# Altium schematic symbol library jlcpcb_2025_04_capacitors_extended_0805.schlib: 3281 symbols (part 13 of 18)
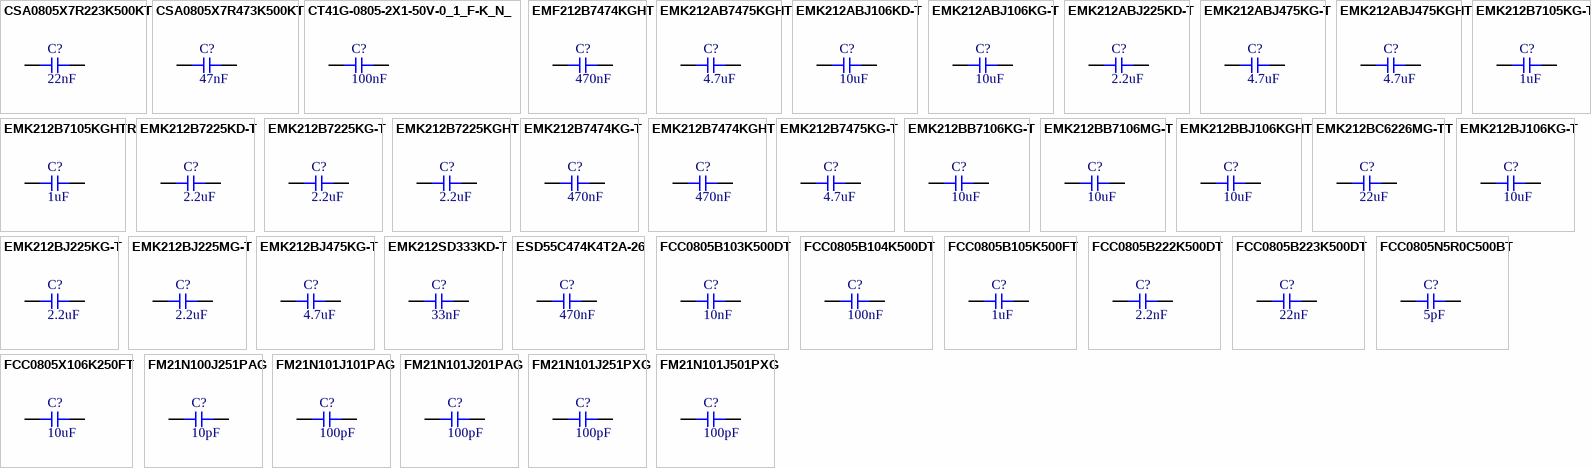
[diagram p94: symbols CSA0805X7R223K500KT to FM21N101J501PXG]

## EMK212B7225KD-T
designator C?  Capacitance: 2.2uF  (hidden comment: *)
Capacitor, Ceramic (MLCC), 2.2uF, ±10%, 16V, X7R, ±10%, SMD 0805; Manufacturer: Taiyo Yuden; Manufacturer Part Number: EMK212B7225KD-T; Package Size: 0805; JLCPCB Basic Part: No; JLCPCB Part Number: C311688; Supplier 1: LCSC; Category: Capacitors - MLCC; Supplier Part Number 1: C311688; Tolerance: ±10%; Voltage Rating: 16V; Temperature Coefficient: X7R; RoHS: Yes; ComponentLink1Description: Datasheet; ComponentLink1URL: https://wmsc.lcsc.com/wmsc/upload/file/pdf/v2/lcsc/2211282230_Taiyo-Yuden-EMK212B7225KD-T_C311688.pdf; ComponentLink2Description: JLCPCB Part URL; ComponentLink2URL: https://jlcpcb.com/partdetail/C311688; ComponentLink3Description: LCSC Part URL; ComponentLink3URL: https://lcsc.com/product-detail/Multilayer-Ceramic-Capacitors-MLCC---SMD-SMT_Taiyo-Yuden-Taiyo-Yuden-EMK212B7225KD-T_C311688.html
footprint CAP-0805 (0805 (2012M) Capacitor)
pins: 1, 2

## EMK212B7225KG-T
designator C?  Capacitance: 2.2uF  (hidden comment: *)
Capacitor, Ceramic (MLCC), 2.2uF, ±10%, 16V, X7R, ±10%, SMD 0805; Manufacturer: Taiyo Yuden; Manufacturer Part Number: EMK212B7225KG-T; Package Size: 0805; JLCPCB Basic Part: No; JLCPCB Part Number: C92761; Supplier 1: LCSC; Category: Capacitors - MLCC; Supplier Part Number 1: C92761; Tolerance: ±10%; Voltage Rating: 16V; Temperature Coefficient: X7R; RoHS: Yes; ComponentLink1Description: Datasheet; ComponentLink1URL: https://wmsc.lcsc.com/wmsc/upload/file/pdf/v2/lcsc/1810091431_Taiyo-Yuden-EMK212B7225KG-T_C92761.pdf; ComponentLink2Description: JLCPCB Part URL; ComponentLink2URL: https://jlcpcb.com/partdetail/C92761; ComponentLink3Description: LCSC Part URL; ComponentLink3URL: https://lcsc.com/product-detail/Multilayer-Ceramic-Capacitors-MLCC---SMD-SMT_Taiyo-Yuden-Taiyo-Yuden-EMK212B7225KG-T_C92761.html
footprint CAP-0805 (0805 (2012M) Capacitor)
pins: 1, 2

## EMK212B7225KGHT
designator C?  Capacitance: 2.2uF  (hidden comment: *)
Capacitor, Ceramic (MLCC), 2.2uF, ±10%, 16V, X7R, ±10%, SMD 0805; Manufacturer: Taiyo Yuden; Manufacturer Part Number: EMK212B7225KGHT; Package Size: 0805; JLCPCB Basic Part: No; JLCPCB Part Number: C385899; Supplier 1: LCSC; Category: Capacitors - MLCC; Supplier Part Number 1: C385899; Tolerance: ±10%; Voltage Rating: 16V; Temperature Coefficient: X7R; RoHS: Yes; ComponentLink1Description: Datasheet; ComponentLink1URL: https://wmsc.lcsc.com/wmsc/upload/file/pdf/v2/lcsc/2304140030_Taiyo-Yuden-EMK212B7225KGHT_C385899.pdf; ComponentLink2Description: JLCPCB Part URL; ComponentLink2URL: https://jlcpcb.com/partdetail/C385899; ComponentLink3Description: LCSC Part URL; ComponentLink3URL: https://lcsc.com/product-detail/Multilayer-Ceramic-Capacitors-MLCC---SMD-SMT_Taiyo-Yuden-Taiyo-Yuden-EMK212B7225KGHT_C385899.html
footprint CAP-0805 (0805 (2012M) Capacitor)
pins: 1, 2

## EMK212B7474KG-T
designator C?  Capacitance: 470nF  (hidden comment: *)
Capacitor, Ceramic (MLCC), 470nF, ±10%, 16V, X7R, ±10%, SMD 0805; Manufacturer: Taiyo Yuden; Manufacturer Part Number: EMK212B7474KG-T; Package Size: 0805; JLCPCB Basic Part: No; JLCPCB Part Number: C385900; Supplier 1: LCSC; Category: Capacitors - MLCC; Supplier Part Number 1: C385900; Tolerance: ±10%; Voltage Rating: 16V; Temperature Coefficient: X7R; RoHS: Yes; ComponentLink1Description: Datasheet; ComponentLink1URL: https://wmsc.lcsc.com/wmsc/upload/file/pdf/v2/lcsc/2211282230_Taiyo-Yuden-EMK212B7474KG-T_C385900.pdf; ComponentLink2Description: JLCPCB Part URL; ComponentLink2URL: https://jlcpcb.com/partdetail/C385900; ComponentLink3Description: LCSC Part URL; ComponentLink3URL: https://lcsc.com/product-detail/Multilayer-Ceramic-Capacitors-MLCC---SMD-SMT_Taiyo-Yuden-Taiyo-Yuden-EMK212B7474KG-T_C385900.html
footprint CAP-0805 (0805 (2012M) Capacitor)
pins: 1, 2

## EMK212B7474KGHT
designator C?  Capacitance: 470nF  (hidden comment: *)
Capacitor, Ceramic (MLCC), 470nF, ±10%, 16V, X7R, ±10%, SMD 0805; Manufacturer: Taiyo Yuden; Manufacturer Part Number: EMK212B7474KGHT; Package Size: 0805; JLCPCB Basic Part: No; JLCPCB Part Number: C651025; Supplier 1: LCSC; Category: Capacitors - MLCC; Supplier Part Number 1: C651025; Tolerance: ±10%; Voltage Rating: 16V; Temperature Coefficient: X7R; RoHS: Yes; ComponentLink1Description: Datasheet; ComponentLink1URL: https://wmsc.lcsc.com/wmsc/upload/file/pdf/v2/lcsc/2304140030_Taiyo-Yuden-EMK212B7474KGHT_C651025.pdf; ComponentLink2Description: JLCPCB Part URL; ComponentLink2URL: https://jlcpcb.com/partdetail/C651025; ComponentLink3Description: LCSC Part URL; ComponentLink3URL: https://lcsc.com/product-detail/Multilayer-Ceramic-Capacitors-MLCC---SMD-SMT_Taiyo-Yuden-Taiyo-Yuden-EMK212B7474KGHT_C651025.html
footprint CAP-0805 (0805 (2012M) Capacitor)
pins: 1, 2

## EMK212B7475KG-T
designator C?  Capacitance: 4.7uF  (hidden comment: *)
Capacitor, Ceramic (MLCC), 4.7uF, ±10%, 16V, X7R, ±10%, SMD 0805; Manufacturer: Taiyo Yuden; Manufacturer Part Number: EMK212B7475KG-T; Package Size: 0805; JLCPCB Basic Part: No; JLCPCB Part Number: C92762; Supplier 1: LCSC; Category: Capacitors - MLCC; Supplier Part Number 1: C92762; Tolerance: ±10%; Voltage Rating: 16V; Temperature Coefficient: X7R; RoHS: Yes; ComponentLink1Description: Datasheet; ComponentLink1URL: https://wmsc.lcsc.com/wmsc/upload/file/pdf/v2/lcsc/2211282300_Taiyo-Yuden-EMK212B7475KG-T_C92762.pdf; ComponentLink2Description: JLCPCB Part URL; ComponentLink2URL: https://jlcpcb.com/partdetail/C92762; ComponentLink3Description: LCSC Part URL; ComponentLink3URL: https://lcsc.com/product-detail/Multilayer-Ceramic-Capacitors-MLCC---SMD-SMT_Taiyo-Yuden-Taiyo-Yuden-EMK212B7475KG-T_C92762.html
footprint CAP-0805 (0805 (2012M) Capacitor)
pins: 1, 2

## EMK212BB7106KG-T
designator C?  Capacitance: 10uF  (hidden comment: *)
Capacitor, Ceramic (MLCC), 10uF, ±10%, 16V, X7R, ±10%, SMD 0805; Manufacturer: Taiyo Yuden; Manufacturer Part Number: EMK212BB7106KG-T; Package Size: 0805; JLCPCB Basic Part: No; JLCPCB Part Number: C2182156; Supplier 1: LCSC; Category: Capacitors - MLCC; Supplier Part Number 1: C2182156; Tolerance: ±10%; Voltage Rating: 16V; Temperature Coefficient: X7R; RoHS: Yes; ComponentLink1Description: Datasheet; ComponentLink1URL: https://wmsc.lcsc.com/wmsc/upload/file/pdf/v2/lcsc/2211282000_Taiyo-Yuden-EMK212BB7106KG-T_C2182156.pdf; ComponentLink2Description: JLCPCB Part URL; ComponentLink2URL: https://jlcpcb.com/partdetail/C2182156; ComponentLink3Description: LCSC Part URL; ComponentLink3URL: https://lcsc.com/product-detail/Multilayer-Ceramic-Capacitors-MLCC---SMD-SMT_Taiyo-Yuden-Taiyo-Yuden-EMK212BB7106KG-T_C2182156.html
footprint CAP-0805 (0805 (2012M) Capacitor)
pins: 1, 2

## EMK212BB7106MG-T
designator C?  Capacitance: 10uF  (hidden comment: *)
Capacitor, Ceramic (MLCC), 10uF, ±20%, 16V, X7R, ±20%, SMD 0805; Manufacturer: Taiyo Yuden; Manufacturer Part Number: EMK212BB7106MG-T; Package Size: 0805; JLCPCB Basic Part: No; JLCPCB Part Number: C141287; Supplier 1: LCSC; Category: Capacitors - MLCC; Supplier Part Number 1: C141287; Tolerance: ±20%; Voltage Rating: 16V; Temperature Coefficient: X7R; RoHS: Yes; ComponentLink1Description: Datasheet; ComponentLink1URL: https://wmsc.lcsc.com/wmsc/upload/file/pdf/v2/lcsc/1810091451_Taiyo-Yuden-EMK212BB7106MG-T_C141287.pdf; ComponentLink2Description: JLCPCB Part URL; ComponentLink2URL: https://jlcpcb.com/partdetail/C141287; ComponentLink3Description: LCSC Part URL; ComponentLink3URL: https://lcsc.com/product-detail/Multilayer-Ceramic-Capacitors-MLCC---SMD-SMT_Taiyo-Yuden-Taiyo-Yuden-EMK212BB7106MG-T_C141287.html
footprint CAP-0805 (0805 (2012M) Capacitor)
pins: 1, 2

## EMK212BBJ106KGHT
designator C?  Capacitance: 10uF  (hidden comment: *)
Capacitor, Ceramic (MLCC), 10uF, ±10%, 16V, X5R, ±10%, SMD 0805; Manufacturer: Taiyo Yuden; Manufacturer Part Number: EMK212BBJ106KGHT; Package Size: 0805; JLCPCB Basic Part: No; JLCPCB Part Number: C650950; Supplier 1: LCSC; Category: Capacitors - MLCC; Supplier Part Number 1: C650950; Tolerance: ±10%; Voltage Rating: 16V; Temperature Coefficient: X5R; RoHS: Yes; ComponentLink1Description: Datasheet; ComponentLink1URL: https://wmsc.lcsc.com/wmsc/upload/file/pdf/v2/lcsc/2211282200_Taiyo-Yuden-EMK212BBJ106KGHT_C650950.pdf; ComponentLink2Description: JLCPCB Part URL; ComponentLink2URL: https://jlcpcb.com/partdetail/C650950; ComponentLink3Description: LCSC Part URL; ComponentLink3URL: https://lcsc.com/product-detail/Multilayer-Ceramic-Capacitors-MLCC---SMD-SMT_Taiyo-Yuden-Taiyo-Yuden-EMK212BBJ106KGHT_C650950.html
footprint CAP-0805 (0805 (2012M) Capacitor)
pins: 1, 2

## EMK212BC6226MG-TT
designator C?  Capacitance: 22uF  (hidden comment: *)
Capacitor, Ceramic (MLCC), 22uF, ±20%, 16V, X6S, ±20%, SMD 0805; Manufacturer: Taiyo Yuden; Manufacturer Part Number: EMK212BC6226MG-TT; Package Size: 0805; JLCPCB Basic Part: No; JLCPCB Part Number: C2179928; Supplier 1: LCSC; Category: Capacitors - MLCC; Supplier Part Number 1: C2179928; Tolerance: ±20%; Voltage Rating: 16V; Temperature Coefficient: X6S; RoHS: Yes; ComponentLink1Description: Datasheet; ComponentLink1URL: https://wmsc.lcsc.com/wmsc/upload/file/pdf/v2/lcsc/2309051402_Taiyo-Yuden-EMK212BC6226MG-TT_C2179928.pdf; ComponentLink2Description: JLCPCB Part URL; ComponentLink2URL: https://jlcpcb.com/partdetail/C2179928; ComponentLink3Description: LCSC Part URL; ComponentLink3URL: https://lcsc.com/product-detail/Multilayer-Ceramic-Capacitors-MLCC---SMD-SMT_Taiyo-Yuden-Taiyo-Yuden-EMK212BC6226MG-TT_C2179928.html
footprint CAP-0805 (0805 (2012M) Capacitor)
pins: 1, 2

## EMK212BJ106KG-T
designator C?  Capacitance: 10uF  (hidden comment: *)
Capacitor, Ceramic (MLCC), 10uF, ±10%, 16V, X5R, ±10%, SMD 0805; Manufacturer: Taiyo Yuden; Manufacturer Part Number: EMK212BJ106KG-T; Package Size: 0805; JLCPCB Basic Part: No; JLCPCB Part Number: C87157; Supplier 1: LCSC; Category: Capacitors - MLCC; Supplier Part Number 1: C87157; Tolerance: ±10%; Voltage Rating: 16V; Temperature Coefficient: X5R; RoHS: Yes; ComponentLink1Description: Datasheet; ComponentLink1URL: https://wmsc.lcsc.com/wmsc/upload/file/pdf/v2/lcsc/2304140030_Taiyo-Yuden-EMK212BJ106KG-T_C87157.pdf; ComponentLink2Description: JLCPCB Part URL; ComponentLink2URL: https://jlcpcb.com/partdetail/C87157; ComponentLink3Description: LCSC Part URL; ComponentLink3URL: https://lcsc.com/product-detail/Multilayer-Ceramic-Capacitors-MLCC---SMD-SMT_Taiyo-Yuden-Taiyo-Yuden-EMK212BJ106KG-T_C87157.html
footprint CAP-0805 (0805 (2012M) Capacitor)
pins: 1, 2

## EMK212BJ225KG-T
designator C?  Capacitance: 2.2uF  (hidden comment: *)
Capacitor, Ceramic (MLCC), 2.2uF, ±10%, 16V, X5R, ±10%, SMD 0805; Manufacturer: Taiyo Yuden; Manufacturer Part Number: EMK212BJ225KG-T; Package Size: 0805; JLCPCB Basic Part: No; JLCPCB Part Number: C319190; Supplier 1: LCSC; Category: Capacitors - MLCC; Supplier Part Number 1: C319190; Tolerance: ±10%; Voltage Rating: 16V; Temperature Coefficient: X5R; RoHS: Yes; ComponentLink1Description: Datasheet; ComponentLink1URL: https://wmsc.lcsc.com/wmsc/upload/file/pdf/v2/lcsc/2304140030_Taiyo-Yuden-EMK212BJ225KG-T_C319190.pdf; ComponentLink2Description: JLCPCB Part URL; ComponentLink2URL: https://jlcpcb.com/partdetail/C319190; ComponentLink3Description: LCSC Part URL; ComponentLink3URL: https://lcsc.com/product-detail/Multilayer-Ceramic-Capacitors-MLCC---SMD-SMT_Taiyo-Yuden-Taiyo-Yuden-EMK212BJ225KG-T_C319190.html
footprint CAP-0805 (0805 (2012M) Capacitor)
pins: 1, 2

## EMK212BJ225MG-T
designator C?  Capacitance: 2.2uF  (hidden comment: *)
Capacitor, Ceramic (MLCC), 2.2uF, ±20%, 16V, X5R, ±20%, SMD 0805; Manufacturer: Taiyo Yuden; Manufacturer Part Number: EMK212BJ225MG-T; Package Size: 0805; JLCPCB Basic Part: No; JLCPCB Part Number: C651026; Supplier 1: LCSC; Category: Capacitors - MLCC; Supplier Part Number 1: C651026; Tolerance: ±20%; Voltage Rating: 16V; Temperature Coefficient: X5R; RoHS: Yes; ComponentLink1Description: Datasheet; ComponentLink1URL: https://wmsc.lcsc.com/wmsc/upload/file/pdf/v2/lcsc/2304140030_Taiyo-Yuden-EMK212BJ225MG-T_C651026.pdf; ComponentLink2Description: JLCPCB Part URL; ComponentLink2URL: https://jlcpcb.com/partdetail/C651026; ComponentLink3Description: LCSC Part URL; ComponentLink3URL: https://lcsc.com/product-detail/Multilayer-Ceramic-Capacitors-MLCC---SMD-SMT_Taiyo-Yuden-Taiyo-Yuden-EMK212BJ225MG-T_C651026.html
footprint CAP-0805 (0805 (2012M) Capacitor)
pins: 1, 2

## EMK212BJ475KG-T
designator C?  Capacitance: 4.7uF  (hidden comment: *)
Capacitor, Ceramic (MLCC), 4.7uF, ±10%, 16V, X5R, ±10%, SMD 0805; Manufacturer: Taiyo Yuden; Manufacturer Part Number: EMK212BJ475KG-T; Package Size: 0805; JLCPCB Basic Part: No; JLCPCB Part Number: C385902; Supplier 1: LCSC; Category: Capacitors - MLCC; Supplier Part Number 1: C385902; Tolerance: ±10%; Voltage Rating: 16V; Temperature Coefficient: X5R; RoHS: Yes; ComponentLink1Description: Datasheet; ComponentLink1URL: https://wmsc.lcsc.com/wmsc/upload/file/pdf/v2/lcsc/2304140030_Taiyo-Yuden-EMK212BJ475KG-T_C385902.pdf; ComponentLink2Description: JLCPCB Part URL; ComponentLink2URL: https://jlcpcb.com/partdetail/C385902; ComponentLink3Description: LCSC Part URL; ComponentLink3URL: https://lcsc.com/product-detail/Multilayer-Ceramic-Capacitors-MLCC---SMD-SMT_Taiyo-Yuden-Taiyo-Yuden-EMK212BJ475KG-T_C385902.html
footprint CAP-0805 (0805 (2012M) Capacitor)
pins: 1, 2

## EMK212SD333KD-T
designator C?  Capacitance: 33nF  (hidden comment: *)
Capacitor, Ceramic (MLCC), 33nF, ±10%, 16V, ±10%, SMD 0805; Manufacturer: Taiyo Yuden; Manufacturer Part Number: EMK212SD333KD-T; Package Size: 0805; JLCPCB Basic Part: No; JLCPCB Part Number: C524971; Supplier 1: LCSC; Category: Capacitors - MLCC; Supplier Part Number 1: C524971; Tolerance: ±10%; Voltage Rating: 16V; RoHS: Yes; ComponentLink1Description: Datasheet; ComponentLink1URL: https://wmsc.lcsc.com/wmsc/upload/file/pdf/v2/lcsc/2211282200_Taiyo-Yuden-EMK212SD333KD-T_C524971.pdf; ComponentLink2Description: JLCPCB Part URL; ComponentLink2URL: https://jlcpcb.com/partdetail/C524971; ComponentLink3Description: LCSC Part URL; ComponentLink3URL: https://lcsc.com/product-detail/Multilayer-Ceramic-Capacitors-MLCC---SMD-SMT_Taiyo-Yuden-Taiyo-Yuden-EMK212SD333KD-T_C524971.html
footprint CAP-0805 (0805 (2012M) Capacitor)
pins: 1, 2

## ESD55C474K4T2A-26
designator C?  Capacitance: 470nF  (hidden comment: *)
Capacitor, Ceramic (MLCC), 470nF, ±10%, 50V, X7R, ±10%, SMD 0805; Manufacturer: Kyocera AVX; Manufacturer Part Number: ESD55C474K4T2A-26; Package Size: 0805; JLCPCB Basic Part: No; JLCPCB Part Number: C2173088; Supplier 1: LCSC; Category: Capacitors - MLCC; Supplier Part Number 1: C2173088; Tolerance: ±10%; Voltage Rating: 50V; Temperature Coefficient: X7R; RoHS: Yes; ComponentLink1Description: Datasheet; ComponentLink1URL: https://wmsc.lcsc.com/wmsc/upload/file/pdf/v2/lcsc/2304140030_Kyocera-AVX-ESD55C474K4T2A-26_C2173088.pdf; ComponentLink2Description: JLCPCB Part URL; ComponentLink2URL: https://jlcpcb.com/partdetail/C2173088; ComponentLink3Description: LCSC Part URL; ComponentLink3URL: https://lcsc.com/product-detail/Multilayer-Ceramic-Capacitors-MLCC---SMD-SMT_Kyocera-AVX-Kyocera-AVX-ESD55C474K4T2A-26_C2173088.html
footprint CAP-0805 (0805 (2012M) Capacitor)
pins: 1, 2

## FCC0805B103K500DT
designator C?  Capacitance: 10nF  (hidden comment: *)
Capacitor, Ceramic (MLCC), 10nF, 50V, X7R, SMD 0805; Manufacturer: FOJAN; Manufacturer Part Number: FCC0805B103K500DT; Package Size: 0805; JLCPCB Basic Part: No; JLCPCB Part Number: C5137493; Supplier 1: LCSC; Category: Capacitors - MLCC; Supplier Part Number 1: C5137493; Voltage Rating: 50V; Temperature Coefficient: X7R; RoHS: Yes; ComponentLink1Description: Datasheet; ComponentLink1URL: https://wmsc.lcsc.com/wmsc/upload/file/pdf/v2/lcsc/2208181800_FOJAN-FCC0805B103K500DT_C5137493.pdf; ComponentLink2Description: JLCPCB Part URL; ComponentLink2URL: https://jlcpcb.com/partdetail/C5137493; ComponentLink3Description: LCSC Part URL; ComponentLink3URL: https://lcsc.com/product-detail/Multilayer-Ceramic-Capacitors-MLCC---SMD-SMT_FOJAN-FOJAN-FCC0805B103K500DT_C5137493.html
footprint CAP-0805 (0805 (2012M) Capacitor)
pins: 1, 2

## FCC0805B104K500DT
designator C?  Capacitance: 100nF  (hidden comment: *)
Capacitor, Ceramic (MLCC), 100nF, ±10%, 50V, X7R, ±10%, SMD 0805; Manufacturer: FOJAN; Manufacturer Part Number: FCC0805B104K500DT; Package Size: 0805; JLCPCB Basic Part: No; JLCPCB Part Number: C5137467; Supplier 1: LCSC; Category: Capacitors - MLCC; Supplier Part Number 1: C5137467; Tolerance: ±10%; Voltage Rating: 50V; Temperature Coefficient: X7R; RoHS: Yes; ComponentLink1Description: Datasheet; ComponentLink1URL: https://wmsc.lcsc.com/wmsc/upload/file/pdf/v2/lcsc/2208181800_FOJAN-FCC0805B104K500DT_C5137467.pdf; ComponentLink2Description: JLCPCB Part URL; ComponentLink2URL: https://jlcpcb.com/partdetail/C5137467; ComponentLink3Description: LCSC Part URL; ComponentLink3URL: https://lcsc.com/product-detail/Multilayer-Ceramic-Capacitors-MLCC---SMD-SMT_FOJAN-FOJAN-FCC0805B104K500DT_C5137467.html
footprint CAP-0805 (0805 (2012M) Capacitor)
pins: 1, 2

## FCC0805B105K500FT
designator C?  Capacitance: 1uF  (hidden comment: *)
Capacitor, Ceramic (MLCC), 1uF, ±10%, 50V, X7R, ±10%, SMD 0805; Manufacturer: FOJAN; Manufacturer Part Number: FCC0805B105K500FT; Package Size: 0805; JLCPCB Basic Part: No; JLCPCB Part Number: C5137478; Supplier 1: LCSC; Category: Capacitors - MLCC; Supplier Part Number 1: C5137478; Tolerance: ±10%; Voltage Rating: 50V; Temperature Coefficient: X7R; RoHS: Yes; ComponentLink1Description: Datasheet; ComponentLink1URL: https://wmsc.lcsc.com/wmsc/upload/file/pdf/v2/lcsc/2208181800_FOJAN-FCC0805B105K500FT_C5137478.pdf; ComponentLink2Description: JLCPCB Part URL; ComponentLink2URL: https://jlcpcb.com/partdetail/C5137478; ComponentLink3Description: LCSC Part URL; ComponentLink3URL: https://lcsc.com/product-detail/Multilayer-Ceramic-Capacitors-MLCC---SMD-SMT_FOJAN-FOJAN-FCC0805B105K500FT_C5137478.html
footprint CAP-0805 (0805 (2012M) Capacitor)
pins: 1, 2

## FCC0805B222K500DT
designator C?  Capacitance: 2.2nF  (hidden comment: *)
Capacitor, Ceramic (MLCC), 2.2nF, ±10%, 50V, X7R, ±10%, SMD 0805; Manufacturer: FOJAN; Manufacturer Part Number: FCC0805B222K500DT; Package Size: 0805; JLCPCB Basic Part: No; JLCPCB Part Number: C5137580; Supplier 1: LCSC; Category: Capacitors - MLCC; Supplier Part Number 1: C5137580; Tolerance: ±10%; Voltage Rating: 50V; Temperature Coefficient: X7R; RoHS: Yes; ComponentLink1Description: Datasheet; ComponentLink1URL: https://wmsc.lcsc.com/wmsc/upload/file/pdf/v2/lcsc/2208181800_FOJAN-FCC0805B222K500DT_C5137580.pdf; ComponentLink2Description: JLCPCB Part URL; ComponentLink2URL: https://jlcpcb.com/partdetail/C5137580; ComponentLink3Description: LCSC Part URL; ComponentLink3URL: https://lcsc.com/product-detail/Multilayer-Ceramic-Capacitors-MLCC---SMD-SMT_FOJAN-FOJAN-FCC0805B222K500DT_C5137580.html
footprint CAP-0805 (0805 (2012M) Capacitor)
pins: 1, 2

## FCC0805B223K500DT
designator C?  Capacitance: 22nF  (hidden comment: *)
Capacitor, Ceramic (MLCC), 22nF, ±10%, 50V, X7R, ±10%, SMD 0805; Manufacturer: FOJAN; Manufacturer Part Number: FCC0805B223K500DT; Package Size: 0805; JLCPCB Basic Part: No; JLCPCB Part Number: C5137639; Supplier 1: LCSC; Category: Capacitors - MLCC; Supplier Part Number 1: C5137639; Tolerance: ±10%; Voltage Rating: 50V; Temperature Coefficient: X7R; RoHS: Yes; ComponentLink1Description: Datasheet; ComponentLink1URL: https://wmsc.lcsc.com/wmsc/upload/file/pdf/v2/lcsc/2208181800_FOJAN-FCC0805B223K500DT_C5137639.pdf; ComponentLink2Description: JLCPCB Part URL; ComponentLink2URL: https://jlcpcb.com/partdetail/C5137639; ComponentLink3Description: LCSC Part URL; ComponentLink3URL: https://lcsc.com/product-detail/Multilayer-Ceramic-Capacitors-MLCC---SMD-SMT_FOJAN-FOJAN-FCC0805B223K500DT_C5137639.html
footprint CAP-0805 (0805 (2012M) Capacitor)
pins: 1, 2

## FCC0805N5R0C500BT
designator C?  Capacitance: 5pF  (hidden comment: *)
Capacitor, Ceramic (MLCC), 5pF, 50V, null, SMD 0805; Manufacturer: FOJAN; Manufacturer Part Number: FCC0805N5R0C500BT; Package Size: 0805; JLCPCB Basic Part: No; JLCPCB Part Number: C7419433; Supplier 1: LCSC; Category: Capacitors - MLCC; Supplier Part Number 1: C7419433; Voltage Rating: 50V; Temperature Coefficient: null; RoHS: Yes; ComponentLink1Description: Datasheet; ComponentLink1URL: https://wmsc.lcsc.com/wmsc/upload/file/pdf/v2/lcsc/2404021725_FOJAN-FCC0805N5R0C500BT_C7419433.pdf; ComponentLink2Description: JLCPCB Part URL; ComponentLink2URL: https://jlcpcb.com/partdetail/C7419433; ComponentLink3Description: LCSC Part URL; ComponentLink3URL: https://lcsc.com/product-detail/Multilayer-Ceramic-Capacitors-MLCC---SMD-SMT_FOJAN-FOJAN-FCC0805N5R0C500BT_C7419433.html
footprint CAP-0805 (0805 (2012M) Capacitor)
pins: 1, 2

## FCC0805X106K250FT
designator C?  Capacitance: 10uF  (hidden comment: *)
Capacitor, Ceramic (MLCC), 10uF, ±10%, 25V, X5R, ±10%, SMD 0805; Manufacturer: FOJAN; Manufacturer Part Number: FCC0805X106K250FT; Package Size: 0805; JLCPCB Basic Part: No; JLCPCB Part Number: C5137488; Supplier 1: LCSC; Category: Capacitors - MLCC; Supplier Part Number 1: C5137488; Tolerance: ±10%; Voltage Rating: 25V; Temperature Coefficient: X5R; RoHS: Yes; ComponentLink1Description: Datasheet; ComponentLink1URL: https://wmsc.lcsc.com/wmsc/upload/file/pdf/v2/lcsc/2208181800_FOJAN-FCC0805X106K250FT_C5137488.pdf; ComponentLink2Description: JLCPCB Part URL; ComponentLink2URL: https://jlcpcb.com/partdetail/C5137488; ComponentLink3Description: LCSC Part URL; ComponentLink3URL: https://lcsc.com/product-detail/Multilayer-Ceramic-Capacitors-MLCC---SMD-SMT_FOJAN-FOJAN-FCC0805X106K250FT_C5137488.html
footprint CAP-0805 (0805 (2012M) Capacitor)
pins: 1, 2

## FM21N100J251PAG
designator C?  Capacitance: 10pF  (hidden comment: *)
Capacitor, Ceramic (MLCC), 10pF, ±5%, 250V, C0G, ±5%, SMD 0805; Manufacturer: PSA(Prosperity Dielectrics); Manufacturer Part Number: FM21N100J251PAG; Package Size: 0805; JLCPCB Basic Part: No; JLCPCB Part Number: C2929106; Supplier 1: LCSC; Category: Capacitors - MLCC; Supplier Part Number 1: C2929106; Tolerance: ±5%; Voltage Rating: 250V; Temperature Coefficient: C0G; RoHS: Yes; ComponentLink1Description: Datasheet; ComponentLink1URL: https://wmsc.lcsc.com/wmsc/upload/file/pdf/v2/lcsc/2201121400_PSA-Prosperity-Dielectrics-FM21N100J251PAG_C2929106.pdf; ComponentLink2Description: JLCPCB Part URL; ComponentLink2URL: https://jlcpcb.com/partdetail/C2929106; ComponentLink3Description: LCSC Part URL; ComponentLink3URL: https://lcsc.com/product-detail/Multilayer-Ceramic-Capacitors-MLCC---SMD-SMT_PSAProsperity-Dielectrics-PSAProsperity-Dielectrics-FM21N100J251PAG_C2929106.html
footprint CAP-0805 (0805 (2012M) Capacitor)
pins: 1, 2

## FM21N101J101PAG
designator C?  Capacitance: 100pF  (hidden comment: *)
Capacitor, Ceramic (MLCC), 100pF, ±5%, 100V, NP0, ±5%, SMD 0805; Manufacturer: PSA(Prosperity Dielectrics); Manufacturer Part Number: FM21N101J101PAG; Package Size: 0805; JLCPCB Basic Part: No; JLCPCB Part Number: C784083; Supplier 1: LCSC; Category: Capacitors - MLCC; Supplier Part Number 1: C784083; Tolerance: ±5%; Voltage Rating: 100V; Temperature Coefficient: NP0; RoHS: Yes; ComponentLink1Description: Datasheet; ComponentLink1URL: https://wmsc.lcsc.com/wmsc/upload/file/pdf/v2/lcsc/2304140030_PSA-Prosperity-Dielectrics-FM21N101J101PAG_C784083.pdf; ComponentLink2Description: JLCPCB Part URL; ComponentLink2URL: https://jlcpcb.com/partdetail/C784083; ComponentLink3Description: LCSC Part URL; ComponentLink3URL: https://lcsc.com/product-detail/Multilayer-Ceramic-Capacitors-MLCC---SMD-SMT_PSAProsperity-Dielectrics-PSAProsperity-Dielectrics-FM21N101J101PAG_C784083.html
footprint CAP-0805 (0805 (2012M) Capacitor)
pins: 1, 2

## FM21N101J201PAG
designator C?  Capacitance: 100pF  (hidden comment: *)
Capacitor, Ceramic (MLCC), 100pF, ±5%, 200V, C0G, ±5%, SMD 0805; Manufacturer: PSA(Prosperity Dielectrics); Manufacturer Part Number: FM21N101J201PAG; Package Size: 0805; JLCPCB Basic Part: No; JLCPCB Part Number: C382250; Supplier 1: LCSC; Category: Capacitors - MLCC; Supplier Part Number 1: C382250; Tolerance: ±5%; Voltage Rating: 200V; Temperature Coefficient: C0G; RoHS: Yes; ComponentLink1Description: Datasheet; ComponentLink1URL: https://wmsc.lcsc.com/wmsc/upload/file/pdf/v2/lcsc/2304140030_PSA-Prosperity-Dielectrics-FM21N101J201PAG_C382250.pdf; ComponentLink2Description: JLCPCB Part URL; ComponentLink2URL: https://jlcpcb.com/partdetail/C382250; ComponentLink3Description: LCSC Part URL; ComponentLink3URL: https://lcsc.com/product-detail/Multilayer-Ceramic-Capacitors-MLCC---SMD-SMT_PSAProsperity-Dielectrics-PSAProsperity-Dielectrics-FM21N101J201PAG_C382250.html
footprint CAP-0805 (0805 (2012M) Capacitor)
pins: 1, 2

## FM21N101J251PXG
designator C?  Capacitance: 100pF  (hidden comment: *)
Capacitor, Ceramic (MLCC), 100pF, 250V, C0G, SMD 0805; Manufacturer: PSA(Prosperity Dielectrics); Manufacturer Part Number: FM21N101J251PXG; Package Size: 0805; JLCPCB Basic Part: No; JLCPCB Part Number: C2847457; Supplier 1: LCSC; Category: Capacitors - MLCC; Supplier Part Number 1: C2847457; Voltage Rating: 250V; Temperature Coefficient: C0G; RoHS: Yes; ComponentLink1Description: Datasheet; ComponentLink1URL: https://wmsc.lcsc.com/wmsc/upload/file/pdf/v2/lcsc/2108142230_PSA-Prosperity-Dielectrics-FM21N101J251PXG_C2847457.pdf; ComponentLink2Description: JLCPCB Part URL; ComponentLink2URL: https://jlcpcb.com/partdetail/C2847457; ComponentLink3Description: LCSC Part URL; ComponentLink3URL: https://lcsc.com/product-detail/Multilayer-Ceramic-Capacitors-MLCC---SMD-SMT_PSAProsperity-Dielectrics-PSAProsperity-Dielectrics-FM21N101J251PXG_C2847457.html
footprint CAP-0805 (0805 (2012M) Capacitor)
pins: 1, 2

## FM21N101J501PXG
designator C?  Capacitance: 100pF  (hidden comment: *)
Capacitor, Ceramic (MLCC), 100pF, ±5%, 500V, C0G, ±5%, SMD 0805; Manufacturer: PSA(Prosperity Dielectrics); Manufacturer Part Number: FM21N101J501PXG; Package Size: 0805; JLCPCB Basic Part: No; JLCPCB Part Number: C701362; Supplier 1: LCSC; Category: Capacitors - MLCC; Supplier Part Number 1: C701362; Tolerance: ±5%; Voltage Rating: 500V; Temperature Coefficient: C0G; RoHS: Yes; ComponentLink1Description: Datasheet; ComponentLink1URL: https://wmsc.lcsc.com/wmsc/upload/file/pdf/v2/lcsc/2304140030_PSA-Prosperity-Dielectrics-FM21N101J501PXG_C701362.pdf; ComponentLink2Description: JLCPCB Part URL; ComponentLink2URL: https://jlcpcb.com/partdetail/C701362; ComponentLink3Description: LCSC Part URL; ComponentLink3URL: https://lcsc.com/product-detail/Multilayer-Ceramic-Capacitors-MLCC---SMD-SMT_PSAProsperity-Dielectrics-PSAProsperity-Dielectrics-FM21N101J501PXG_C701362.html
footprint CAP-0805 (0805 (2012M) Capacitor)
pins: 1, 2

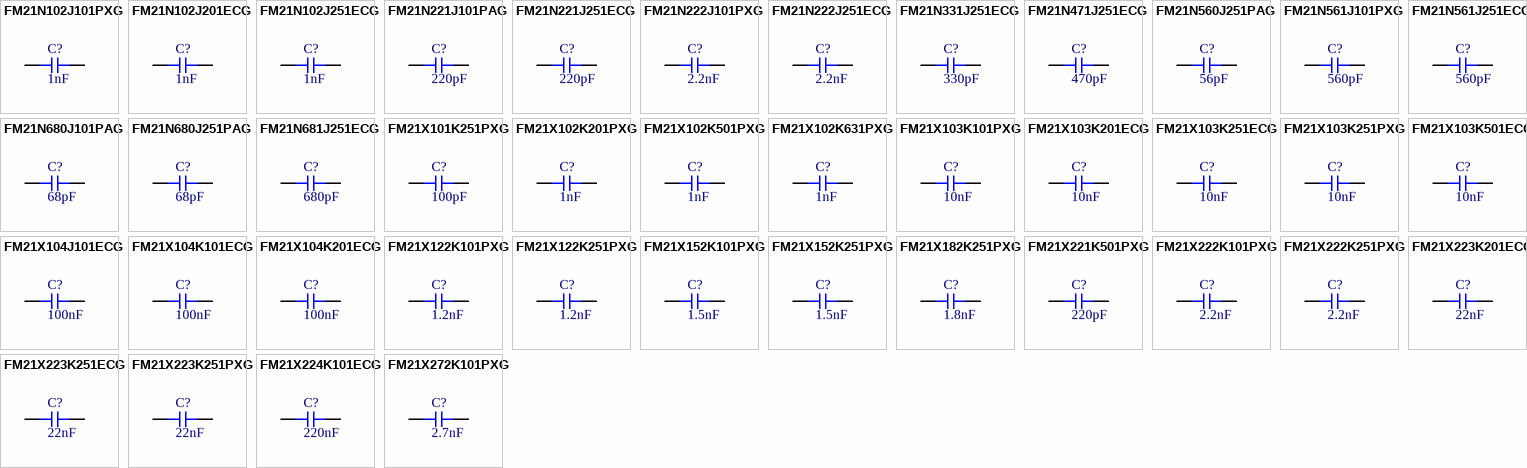
[diagram p56: symbols FM21N102J101PXG to FM21X272K101PXG]

## FM21N102J101PXG
designator C?  Capacitance: 1nF  (hidden comment: *)
Capacitor, Ceramic (MLCC), 1nF, ±5%, 100V, C0G, ±5%, SMD 0805; Manufacturer: PSA(Prosperity Dielectrics); Manufacturer Part Number: FM21N102J101PXG; Package Size: 0805; JLCPCB Basic Part: No; JLCPCB Part Number: C525178; Supplier 1: LCSC; Category: Capacitors - MLCC; Supplier Part Number 1: C525178; Tolerance: ±5%; Voltage Rating: 100V; Temperature Coefficient: C0G; RoHS: Yes; ComponentLink1Description: Datasheet; ComponentLink1URL: https://wmsc.lcsc.com/wmsc/upload/file/pdf/v2/lcsc/2304140030_PSA-Prosperity-Dielectrics-FM21N102J101PXG_C525178.pdf; ComponentLink2Description: JLCPCB Part URL; ComponentLink2URL: https://jlcpcb.com/partdetail/C525178; ComponentLink3Description: LCSC Part URL; ComponentLink3URL: https://lcsc.com/product-detail/Multilayer-Ceramic-Capacitors-MLCC---SMD-SMT_PSAProsperity-Dielectrics-PSAProsperity-Dielectrics-FM21N102J101PXG_C525178.html
footprint CAP-0805 (0805 (2012M) Capacitor)
pins: 1, 2

## FM21N102J201ECG
designator C?  Capacitance: 1nF  (hidden comment: *)
Capacitor, Ceramic (MLCC), 1nF, ±5%, 200V, C0G, ±5%, SMD 0805; Manufacturer: PSA(Prosperity Dielectrics); Manufacturer Part Number: FM21N102J201ECG; Package Size: 0805; JLCPCB Basic Part: No; JLCPCB Part Number: C382249; Supplier 1: LCSC; Category: Capacitors - MLCC; Supplier Part Number 1: C382249; Tolerance: ±5%; Voltage Rating: 200V; Temperature Coefficient: C0G; RoHS: Yes; ComponentLink1Description: Datasheet; ComponentLink1URL: https://wmsc.lcsc.com/wmsc/upload/file/pdf/v2/lcsc/2304140030_PSA-Prosperity-Dielectrics-FM21N102J201ECG_C382249.pdf; ComponentLink2Description: JLCPCB Part URL; ComponentLink2URL: https://jlcpcb.com/partdetail/C382249; ComponentLink3Description: LCSC Part URL; ComponentLink3URL: https://lcsc.com/product-detail/Multilayer-Ceramic-Capacitors-MLCC---SMD-SMT_PSAProsperity-Dielectrics-PSAProsperity-Dielectrics-FM21N102J201ECG_C382249.html
footprint CAP-0805 (0805 (2012M) Capacitor)
pins: 1, 2

## FM21N102J251ECG
designator C?  Capacitance: 1nF  (hidden comment: *)
Capacitor, Ceramic (MLCC), 1nF, 250V, SMD 0805; Manufacturer: PSA(Prosperity Dielectrics); Manufacturer Part Number: FM21N102J251ECG; Package Size: 0805; JLCPCB Basic Part: No; JLCPCB Part Number: C2843395; Supplier 1: LCSC; Category: Capacitors - MLCC; Supplier Part Number 1: C2843395; Voltage Rating: 250V; RoHS: Yes; ComponentLink1Description: Datasheet; ComponentLink1URL: https://wmsc.lcsc.com/wmsc/upload/file/pdf/v2/lcsc/2108072030_PSA-Prosperity-Dielectrics-FM21N102J251ECG_C2843395.pdf; ComponentLink2Description: JLCPCB Part URL; ComponentLink2URL: https://jlcpcb.com/partdetail/C2843395; ComponentLink3Description: LCSC Part URL; ComponentLink3URL: https://lcsc.com/product-detail/Multilayer-Ceramic-Capacitors-MLCC---SMD-SMT_PSAProsperity-Dielectrics-PSAProsperity-Dielectrics-FM21N102J251ECG_C2843395.html
footprint CAP-0805 (0805 (2012M) Capacitor)
pins: 1, 2

## FM21N221J101PAG
designator C?  Capacitance: 220pF  (hidden comment: *)
Capacitor, Ceramic (MLCC), 220pF, ±5%, 100V, C0G, ±5%, SMD 0805; Manufacturer: PSA(Prosperity Dielectrics); Manufacturer Part Number: FM21N221J101PAG; Package Size: 0805; JLCPCB Basic Part: No; JLCPCB Part Number: C2929107; Supplier 1: LCSC; Category: Capacitors - MLCC; Supplier Part Number 1: C2929107; Tolerance: ±5%; Voltage Rating: 100V; Temperature Coefficient: C0G; RoHS: Yes; ComponentLink1Description: Datasheet; ComponentLink1URL: https://wmsc.lcsc.com/wmsc/upload/file/pdf/v2/lcsc/2201121400_PSA-Prosperity-Dielectrics-FM21N221J101PAG_C2929107.pdf; ComponentLink2Description: JLCPCB Part URL; ComponentLink2URL: https://jlcpcb.com/partdetail/C2929107; ComponentLink3Description: LCSC Part URL; ComponentLink3URL: https://lcsc.com/product-detail/Multilayer-Ceramic-Capacitors-MLCC---SMD-SMT_PSAProsperity-Dielectrics-PSAProsperity-Dielectrics-FM21N221J101PAG_C2929107.html
footprint CAP-0805 (0805 (2012M) Capacitor)
pins: 1, 2

## FM21N221J251ECG
designator C?  Capacitance: 220pF  (hidden comment: *)
Capacitor, Ceramic (MLCC), 220pF, ±5%, 250V, C0G, ±5%, SMD 0805; Manufacturer: PSA(Prosperity Dielectrics); Manufacturer Part Number: FM21N221J251ECG; Package Size: 0805; JLCPCB Basic Part: No; JLCPCB Part Number: C701363; Supplier 1: LCSC; Category: Capacitors - MLCC; Supplier Part Number 1: C701363; Tolerance: ±5%; Voltage Rating: 250V; Temperature Coefficient: C0G; RoHS: Yes; ComponentLink1Description: Datasheet; ComponentLink1URL: https://wmsc.lcsc.com/wmsc/upload/file/pdf/v2/lcsc/2304140030_PSA-Prosperity-Dielectrics-FM21N221J251ECG_C701363.pdf; ComponentLink2Description: JLCPCB Part URL; ComponentLink2URL: https://jlcpcb.com/partdetail/C701363; ComponentLink3Description: LCSC Part URL; ComponentLink3URL: https://lcsc.com/product-detail/Multilayer-Ceramic-Capacitors-MLCC---SMD-SMT_PSAProsperity-Dielectrics-PSAProsperity-Dielectrics-FM21N221J251ECG_C701363.html
footprint CAP-0805 (0805 (2012M) Capacitor)
pins: 1, 2

## FM21N222J101PXG
designator C?  Capacitance: 2.2nF  (hidden comment: *)
Capacitor, Ceramic (MLCC), 2.2nF, ±5%, 100V, C0G, ±5%, SMD 0805; Manufacturer: PSA(Prosperity Dielectrics); Manufacturer Part Number: FM21N222J101PXG; Package Size: 0805; JLCPCB Basic Part: No; JLCPCB Part Number: C2847436; Supplier 1: LCSC; Category: Capacitors - MLCC; Supplier Part Number 1: C2847436; Tolerance: ±5%; Voltage Rating: 100V; Temperature Coefficient: C0G; RoHS: Yes; ComponentLink1Description: Datasheet; ComponentLink1URL: https://wmsc.lcsc.com/wmsc/upload/file/pdf/v2/lcsc/2108142230_PSA-Prosperity-Dielectrics-FM21N222J101PXG_C2847436.pdf; ComponentLink2Description: JLCPCB Part URL; ComponentLink2URL: https://jlcpcb.com/partdetail/C2847436; ComponentLink3Description: LCSC Part URL; ComponentLink3URL: https://lcsc.com/product-detail/Multilayer-Ceramic-Capacitors-MLCC---SMD-SMT_PSAProsperity-Dielectrics-PSAProsperity-Dielectrics-FM21N222J101PXG_C2847436.html
footprint CAP-0805 (0805 (2012M) Capacitor)
pins: 1, 2

## FM21N222J251ECG
designator C?  Capacitance: 2.2nF  (hidden comment: *)
Capacitor, Ceramic (MLCC), 2.2nF, ±5%, 250V, ±5%, SMD 0805; Manufacturer: PSA(Prosperity Dielectrics); Manufacturer Part Number: FM21N222J251ECG; Package Size: 0805; JLCPCB Basic Part: No; JLCPCB Part Number: C2843397; Supplier 1: LCSC; Category: Capacitors - MLCC; Supplier Part Number 1: C2843397; Tolerance: ±5%; Voltage Rating: 250V; RoHS: Yes; ComponentLink1Description: Datasheet; ComponentLink1URL: https://wmsc.lcsc.com/wmsc/upload/file/pdf/v2/lcsc/2108072030_PSA-Prosperity-Dielectrics-FM21N222J251ECG_C2843397.pdf; ComponentLink2Description: JLCPCB Part URL; ComponentLink2URL: https://jlcpcb.com/partdetail/C2843397; ComponentLink3Description: LCSC Part URL; ComponentLink3URL: https://lcsc.com/product-detail/Multilayer-Ceramic-Capacitors-MLCC---SMD-SMT_PSAProsperity-Dielectrics-PSAProsperity-Dielectrics-FM21N222J251ECG_C2843397.html
footprint CAP-0805 (0805 (2012M) Capacitor)
pins: 1, 2

## FM21N331J251ECG
designator C?  Capacitance: 330pF  (hidden comment: *)
Capacitor, Ceramic (MLCC), 330pF, ±5%, 250V, C0G, ±5%, SMD 0805; Manufacturer: PSA(Prosperity Dielectrics); Manufacturer Part Number: FM21N331J251ECG; Package Size: 0805; JLCPCB Basic Part: No; JLCPCB Part Number: C2847453; Supplier 1: LCSC; Category: Capacitors - MLCC; Supplier Part Number 1: C2847453; Tolerance: ±5%; Voltage Rating: 250V; Temperature Coefficient: C0G; RoHS: Yes; ComponentLink1Description: Datasheet; ComponentLink1URL: https://wmsc.lcsc.com/wmsc/upload/file/pdf/v2/lcsc/2108142230_PSA-Prosperity-Dielectrics-FM21N331J251ECG_C2847453.pdf; ComponentLink2Description: JLCPCB Part URL; ComponentLink2URL: https://jlcpcb.com/partdetail/C2847453; ComponentLink3Description: LCSC Part URL; ComponentLink3URL: https://lcsc.com/product-detail/Multilayer-Ceramic-Capacitors-MLCC---SMD-SMT_PSAProsperity-Dielectrics-PSAProsperity-Dielectrics-FM21N331J251ECG_C2847453.html
footprint CAP-0805 (0805 (2012M) Capacitor)
pins: 1, 2

## FM21N471J251ECG
designator C?  Capacitance: 470pF  (hidden comment: *)
Capacitor, Ceramic (MLCC), 470pF, 250V, C0G, SMD 0805; Manufacturer: PSA(Prosperity Dielectrics); Manufacturer Part Number: FM21N471J251ECG; Package Size: 0805; JLCPCB Basic Part: No; JLCPCB Part Number: C2915698; Supplier 1: LCSC; Category: Capacitors - MLCC; Supplier Part Number 1: C2915698; Voltage Rating: 250V; Temperature Coefficient: C0G; RoHS: Yes; ComponentLink1Description: Datasheet; ComponentLink1URL: https://wmsc.lcsc.com/wmsc/upload/file/pdf/v2/lcsc/2111172030_PSA-Prosperity-Dielectrics-FM21N471J251ECG_C2915698.pdf; ComponentLink2Description: JLCPCB Part URL; ComponentLink2URL: https://jlcpcb.com/partdetail/C2915698; ComponentLink3Description: LCSC Part URL; ComponentLink3URL: https://lcsc.com/product-detail/Multilayer-Ceramic-Capacitors-MLCC---SMD-SMT_PSAProsperity-Dielectrics-PSAProsperity-Dielectrics-FM21N471J251ECG_C2915698.html
footprint CAP-0805 (0805 (2012M) Capacitor)
pins: 1, 2

## FM21N560J251PAG
designator C?  Capacitance: 56pF  (hidden comment: *)
Capacitor, Ceramic (MLCC), 56pF, 250V, C0G, SMD 0805; Manufacturer: PSA(Prosperity Dielectrics); Manufacturer Part Number: FM21N560J251PAG; Package Size: 0805; JLCPCB Basic Part: No; JLCPCB Part Number: C2929695; Supplier 1: LCSC; Category: Capacitors - MLCC; Supplier Part Number 1: C2929695; Voltage Rating: 250V; Temperature Coefficient: C0G; RoHS: Yes; ComponentLink1Description: Datasheet; ComponentLink1URL: https://wmsc.lcsc.com/wmsc/upload/file/pdf/v2/lcsc/2201121430_PSA-Prosperity-Dielectrics-FM21N560J251PAG_C2929695.pdf; ComponentLink2Description: JLCPCB Part URL; ComponentLink2URL: https://jlcpcb.com/partdetail/C2929695; ComponentLink3Description: LCSC Part URL; ComponentLink3URL: https://lcsc.com/product-detail/Multilayer-Ceramic-Capacitors-MLCC---SMD-SMT_PSAProsperity-Dielectrics-PSAProsperity-Dielectrics-FM21N560J251PAG_C2929695.html
footprint CAP-0805 (0805 (2012M) Capacitor)
pins: 1, 2

## FM21N561J101PXG
designator C?  Capacitance: 560pF  (hidden comment: *)
Capacitor, Ceramic (MLCC), 560pF, ±5%, 100V, C0G, ±5%, SMD 0805; Manufacturer: PSA(Prosperity Dielectrics); Manufacturer Part Number: FM21N561J101PXG; Package Size: 0805; JLCPCB Basic Part: No; JLCPCB Part Number: C382247; Supplier 1: LCSC; Category: Capacitors - MLCC; Supplier Part Number 1: C382247; Tolerance: ±5%; Voltage Rating: 100V; Temperature Coefficient: C0G; RoHS: Yes; ComponentLink1Description: Datasheet; ComponentLink1URL: https://wmsc.lcsc.com/wmsc/upload/file/pdf/v2/lcsc/2304140030_PSA-Prosperity-Dielectrics-FM21N561J101PXG_C382247.pdf; ComponentLink2Description: JLCPCB Part URL; ComponentLink2URL: https://jlcpcb.com/partdetail/C382247; ComponentLink3Description: LCSC Part URL; ComponentLink3URL: https://lcsc.com/product-detail/Multilayer-Ceramic-Capacitors-MLCC---SMD-SMT_PSAProsperity-Dielectrics-PSAProsperity-Dielectrics-FM21N561J101PXG_C382247.html
footprint CAP-0805 (0805 (2012M) Capacitor)
pins: 1, 2

## FM21N561J251ECG
designator C?  Capacitance: 560pF  (hidden comment: *)
Capacitor, Ceramic (MLCC), 560pF, 250V, C0G, SMD 0805; Manufacturer: PSA(Prosperity Dielectrics); Manufacturer Part Number: FM21N561J251ECG; Package Size: 0805; JLCPCB Basic Part: No; JLCPCB Part Number: C2915699; Supplier 1: LCSC; Category: Capacitors - MLCC; Supplier Part Number 1: C2915699; Voltage Rating: 250V; Temperature Coefficient: C0G; RoHS: Yes; ComponentLink1Description: Datasheet; ComponentLink1URL: https://wmsc.lcsc.com/wmsc/upload/file/pdf/v2/lcsc/2111172030_PSA-Prosperity-Dielectrics-FM21N561J251ECG_C2915699.pdf; ComponentLink2Description: JLCPCB Part URL; ComponentLink2URL: https://jlcpcb.com/partdetail/C2915699; ComponentLink3Description: LCSC Part URL; ComponentLink3URL: https://lcsc.com/product-detail/Multilayer-Ceramic-Capacitors-MLCC---SMD-SMT_PSAProsperity-Dielectrics-PSAProsperity-Dielectrics-FM21N561J251ECG_C2915699.html
footprint CAP-0805 (0805 (2012M) Capacitor)
pins: 1, 2

## FM21N680J101PAG
designator C?  Capacitance: 68pF  (hidden comment: *)
Capacitor, Ceramic (MLCC), 68pF, ±5%, 100V, C0G, ±5%, SMD 0805; Manufacturer: PSA(Prosperity Dielectrics); Manufacturer Part Number: FM21N680J101PAG; Package Size: 0805; JLCPCB Basic Part: No; JLCPCB Part Number: C382246; Supplier 1: LCSC; Category: Capacitors - MLCC; Supplier Part Number 1: C382246; Tolerance: ±5%; Voltage Rating: 100V; Temperature Coefficient: C0G; RoHS: Yes; ComponentLink1Description: Datasheet; ComponentLink1URL: https://wmsc.lcsc.com/wmsc/upload/file/pdf/v2/lcsc/2304140030_PSA-Prosperity-Dielectrics-FM21N680J101PAG_C382246.pdf; ComponentLink2Description: JLCPCB Part URL; ComponentLink2URL: https://jlcpcb.com/partdetail/C382246; ComponentLink3Description: LCSC Part URL; ComponentLink3URL: https://lcsc.com/product-detail/Multilayer-Ceramic-Capacitors-MLCC---SMD-SMT_PSAProsperity-Dielectrics-PSAProsperity-Dielectrics-FM21N680J101PAG_C382246.html
footprint CAP-0805 (0805 (2012M) Capacitor)
pins: 1, 2

## FM21N680J251PAG
designator C?  Capacitance: 68pF  (hidden comment: *)
Capacitor, Ceramic (MLCC), 68pF, ±5%, 250V, C0G, ±5%, SMD 0805; Manufacturer: PSA(Prosperity Dielectrics); Manufacturer Part Number: FM21N680J251PAG; Package Size: 0805; JLCPCB Basic Part: No; JLCPCB Part Number: C2915700; Supplier 1: LCSC; Category: Capacitors - MLCC; Supplier Part Number 1: C2915700; Tolerance: ±5%; Voltage Rating: 250V; Temperature Coefficient: C0G; RoHS: Yes; ComponentLink1Description: Datasheet; ComponentLink1URL: https://wmsc.lcsc.com/wmsc/upload/file/pdf/v2/lcsc/2111172030_PSA-Prosperity-Dielectrics-FM21N680J251PAG_C2915700.pdf; ComponentLink2Description: JLCPCB Part URL; ComponentLink2URL: https://jlcpcb.com/partdetail/C2915700; ComponentLink3Description: LCSC Part URL; ComponentLink3URL: https://lcsc.com/product-detail/Multilayer-Ceramic-Capacitors-MLCC---SMD-SMT_PSAProsperity-Dielectrics-PSAProsperity-Dielectrics-FM21N680J251PAG_C2915700.html
footprint CAP-0805 (0805 (2012M) Capacitor)
pins: 1, 2
